# Altium footprint library 20-Switches.PcbLib: 110 footprints (part 7 of 7)
Each footprint in its own frame and in the unit in brackets; x right, y up, seen from the top. Pads: shape width x height; smd on the part's side, far side on the other; paste and mask are expansions set on the pad; w line width, h text height; cw(c..) or ccw(c..) is an arc to the next point about the centre after c.
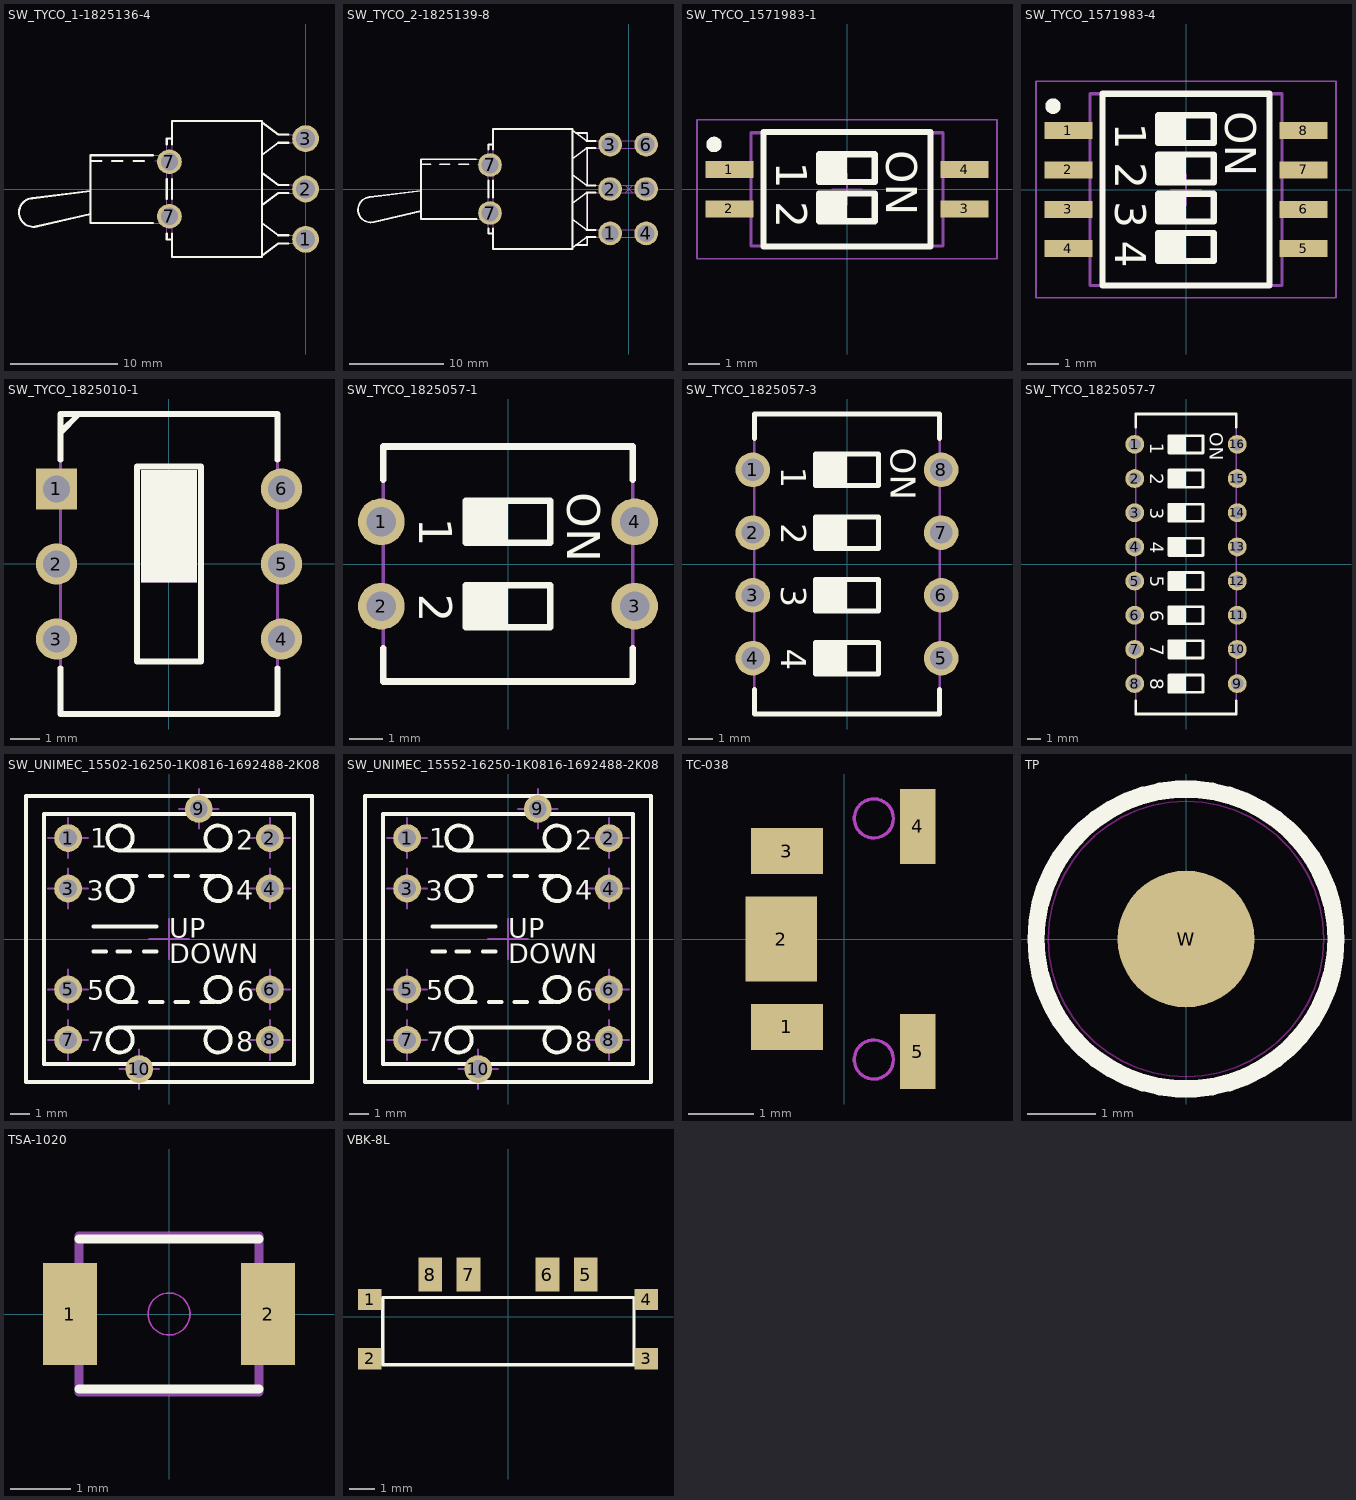
[diagram p6: the footprints below, top view; thin cyan lines are the x and y axes]

## SW_TYCO_1-1825136-4 [mm] "Right Angled SPDT Toggle Switch (ON,NONE,ON Function), .270\" Actuator, Unthreaded Bushing, A Series"
height 6.85
pads (5):
  round 2.5 hole 1.8: 1(0,-4.7) 2(0,0) 3(0,4.7)
  round 2.3 hole 1.6: 7(-12.7,-2.54) 7(-12.7,2.54)
Top Overlay:
  lines w0.2: -20.066,-2.343 -25.037,-3.479 cw(c-25.399,-2.194) -25.498,-0.863 -20.066,-0.184 ; -20.066,2.615 -19.066,2.615 ; -18.066,2.615 -17.066,2.615 ; -16.066,2.615 -15.066,2.615 ; -14.234,3.148 -20.066,3.148 -20.066,-3.175 -14.223,-3.175 ; -12.954,-4.17 -12.954,-4.7 -12.446,-4.7 ; -12.954,-0.91 -12.954,0.91 ; -12.954,4.17 -12.954,4.7 -12.446,4.7 ; -12.446,-4.17 -12.446,-6.35 -4.064,-6.35 ; -12.446,-0.91 -12.446,0.91 ; -12.446,4.17 -12.446,6.35 -4.064,6.35 ; -4.064,-6.2 -2.572,-5.081 -1.605,-5.081 ; -4.064,-3.2 -2.572,-4.319 -1.605,-4.319 ; -4.064,-1.5 -2.572,-0.381 -1.605,-0.381 ; -4.064,1.5 -2.572,0.381 -1.605,0.381 ; -4.064,3.2 -2.572,4.319 -1.605,4.319 ; -4.064,6.2 -2.572,5.081 -1.605,5.081 ; -4.064,-6.35 -4.064,6.35 ; -4.064,-6.35 -4.064,6.35 ; -4.064,-6.35 -4.064,6.35 ; -4.064,-5.081 -4.064,-4.319 -4.064,-5.081 ; -4.064,-0.381 -4.064,0.381 -4.064,-0.381 ; -4.064,4.319 -4.064,5.081 -4.064,4.319
Mechanical 8:
  lines w0.1: -13.2,-2.54 -12.7,-2.54 ; -13.2,2.54 -12.7,2.54 ; -12.7,-3.04 -12.7,-2.54 ; -12.7,-2.04 -12.7,-2.54 ; -12.7,2.04 -12.7,2.54 ; -12.7,3.04 -12.7,2.54 ; -12.2,-2.54 -12.7,-2.54 ; -12.2,2.54 -12.7,2.54 ; -0.5,-4.7 0,-4.7 ; -0.5,0 0,0 ; -0.5,4.7 0,4.7 ; 0,-5.2 0,-4.7 ; 0,-4.2 0,-4.7 ; 0,-0.5 0,0 ; 0,0.5 0,0 ; 0,4.2 0,4.7 ; 0,5.2 0,4.7 ; 0.5,-4.7 0,-4.7 ; 0.5,0 0,0 ; 0.5,4.7 0,4.7
Mechanical 14:
  lines w0.1: -20.066,-2.343 -25.037,-3.479 cw(c-25.399,-2.194) -25.498,-0.863 -20.066,-0.184 ; -20.066,2.615 -19.066,2.615 ; -18.066,2.615 -17.066,2.615 ; -16.066,2.615 -15.066,2.615 ; -14.066,2.615 -13.066,2.615 ; -12.954,-3.175 -20.066,-3.175 -20.066,3.148 -12.954,3.148 ; -12.446,-4.7 -12.954,-4.7 -12.954,4.7 -12.446,4.7 ; -4.064,-6.2 -2.572,-5.081 0.635,-5.081 0.635,-4.319 -2.572,-4.319 -4.064,-3.2 ; -4.064,-1.5 -2.572,-0.381 0.635,-0.381 0.635,0.381 -2.572,0.381 -4.064,1.5 ; -4.064,3.2 -2.572,4.319 0.635,4.319 0.635,5.081 -2.572,5.081 -4.064,6.2 ; -4.064,-6.35 -4.064,6.35 ; -4.064,-6.35 -4.064,6.35 ; -4.064,-6.35 -4.064,6.35 ; -4.064,-6.35 -12.446,-6.35 -12.446,6.35 -4.064,6.35 ; -4.064,-5.081 -4.064,-4.319 -4.064,-5.081 ; -4.064,-0.381 -4.064,0.381 -4.064,-0.381 ; -4.064,4.319 -4.064,5.081 -4.064,4.319
3D body "SW_TYCO_1-1825136-4.stp": height 6.86, standoff -3.17, extent -26.714,-6.35 0.635,6.35

## SW_TYCO_2-1825139-8 [mm] "Right Angled DPDT Toggle Switch (ON,ON,ON Function), .270\" Actuator, Unthreaded Bushing, A Series"
height 11.43
pads (8):
  round 2.5 hole 1.8: 1(-1.982,-4.7) 2(-1.982,0) 3(-1.982,4.7) 4(1.828,-4.7) 5(1.828,0) 6(1.828,4.7) 7(-14.682,-2.54) 7(-14.682,2.54)
Top Overlay:
  lines w0.2: -27.403,-0.863 ccw(c-27.304,-2.194) -26.942,-3.479 ; -27.403,-0.863 ccw(c-27.304,-2.194) -26.942,-3.479 ; -27.403,-0.863 -21.971,-0.184 -27.403,-0.863 ; -26.942,-3.479 -21.971,-2.343 -26.942,-3.479 ; -21.971,-3.175 -21.971,3.148 ; -21.971,-3.175 -16.128,-3.175 -21.971,-3.175 ; -21.971,-3.175 -21.971,3.148 ; -21.971,3.148 -16.139,3.148 -21.971,3.148 ; -14.859,-4.7 -14.859,-4.17 -14.859,-4.7 ; -14.859,-4.7 -14.351,-4.7 -14.859,-4.7 ; -14.859,4.7 -14.859,4.17 -14.859,4.7 ; -14.859,4.7 -14.351,4.7 -14.859,4.7 ; -14.351,-6.35 -14.351,-4.17 -14.351,-6.35 ; -14.351,-6.35 -5.969,-6.35 ; -14.351,-6.35 -5.969,-6.35 ; -14.351,6.35 -14.351,4.17 -14.351,6.35 ; -14.351,6.35 -5.969,6.35 ; -14.351,6.35 -5.969,6.35 ; -5.969,-6.35 -5.969,6.35 ; -5.969,-6.35 -5.969,6.35 ; -5.969,-6.35 -5.969,6.35 ; -5.969,-6.35 -5.969,6.35 ; -5.969,-6.35 -5.969,6.35 ; -5.969,-6.35 -5.969,6.35 ; -5.969,-5.081 -5.969,-4.319 ; -5.969,-5.081 -5.969,-4.319 ; -5.969,-5.081 -5.969,-4.319 ; -5.969,-5.081 -5.969,-4.319 ; -5.969,-0.381 -5.969,0.381 ; -5.969,-0.381 -5.969,0.381 ; -5.969,-0.381 -5.969,0.381 ; -5.969,-0.381 -5.969,0.381 ; -5.969,4.319 -5.969,5.081 ; -5.969,4.319 -5.969,5.081 ; -5.969,4.319 -5.969,5.081 ; -5.969,4.319 -5.969,5.081 ; -4.477,-5.081 -3.51,-5.081 -4.477,-5.081 ; -4.477,-5.081 -5.969,-6.2 -4.477,-5.081 ; -4.477,-4.319 -3.51,-4.319 -4.477,-4.319 ; -4.477,-4.319 -5.969,-3.2 -4.477,-4.319 ; -4.477,-0.381 -3.51,-0.381 -4.477,-0.381 ; -4.477,-0.381 -5.969,-1.5 -4.477,-0.381 ; -4.477,0.381 -3.51,0.381 -4.477,0.381 ; -4.477,0.381 -5.969,1.5 -4.477,0.381 ; -4.477,4.319 -3.51,4.319 -4.477,4.319 ; -4.477,4.319 -5.969,3.2 -4.477,4.319 ; -4.477,5.081 -3.51,5.081 -4.477,5.081 ; -4.477,5.081 -5.969,6.2 -4.477,5.081 ; -4.4,-5.94 -5.622,-5.94 -4.4,-5.94 ; -4.4,-5.94 -4.4,-5.081 -4.4,-5.94 ; -4.4,5.94 -4.4,5.081 -4.4,5.94 ; -4.4,5.94 -5.622,5.94 -4.4,5.94 ; -21.971,2.615 -20.971,2.615 -21.971,2.615 ; -19.971,2.615 -18.971,2.615 -19.971,2.615 ; -17.971,2.615 -16.971,2.615 -17.971,2.615 ; -14.859,-0.91 -14.859,0.91 -14.859,-0.91 ; -14.351,-0.91 -14.351,0.91 -14.351,-0.91 ; -4.4,-4.319 -4.4,-0.381 -4.4,-4.319 ; -4.4,0.381 -4.4,4.319 -4.4,0.381
Mechanical 8:
  lines w0.1: -15.105,-2.54 -14.605,-2.54 ; -15.105,2.54 -14.605,2.54 ; -14.605,-3.04 -14.605,-2.54 ; -14.605,-2.04 -14.605,-2.54 ; -14.605,2.04 -14.605,2.54 ; -14.605,3.04 -14.605,2.54 ; -14.105,-2.54 -14.605,-2.54 ; -14.105,2.54 -14.605,2.54 ; -2.405,-4.7 -1.905,-4.7 ; -2.405,0 -1.905,0 ; -2.405,4.7 -1.905,4.7 ; -1.905,-5.2 -1.905,-4.7 ; -1.905,-4.2 -1.905,-4.7 ; -1.905,-0.5 -1.905,0 ; -1.905,0.5 -1.905,0 ; -1.905,4.2 -1.905,4.7 ; -1.905,5.2 -1.905,4.7 ; -1.405,-4.7 -1.905,-4.7 ; -1.405,0 -1.905,0 ; -1.405,4.7 -1.905,4.7 ; -0.354,-0.354 0,0 ; -0.354,0.354 0,0 ; 0.354,-0.354 0,0 ; 0.354,0.354 0,0 ; 1.405,-4.7 1.905,-4.7 ; 1.405,0 1.905,0 ; 1.405,4.7 1.905,4.7 ; 1.905,-5.2 1.905,-4.7 ; 1.905,-4.2 1.905,-4.7 ; 1.905,-0.5 1.905,0 ; 1.905,0.5 1.905,0 ; 1.905,4.2 1.905,4.7 ; 1.905,5.2 1.905,4.7 ; 2.405,-4.7 1.905,-4.7 ; 2.405,0 1.905,0 ; 2.405,4.7 1.905,4.7
Mechanical 14:
  lines w0.1: -27.403,-0.863 ccw(c-27.304,-2.194) -26.942,-3.479 ; -27.403,-0.863 ccw(c-27.304,-2.194) -26.942,-3.479 ; -27.403,-0.863 -21.971,-0.184 -27.403,-0.863 ; -26.942,-3.479 -21.971,-2.343 -26.942,-3.479 ; -21.971,-3.175 -21.971,3.148 ; -21.971,-3.175 -14.859,-3.175 -21.971,-3.175 ; -21.971,-3.175 -21.971,3.148 ; -21.971,3.148 -14.859,3.148 -21.971,3.148 ; -14.859,-4.7 -14.351,-4.7 -14.859,-4.7 ; -14.859,-4.7 -14.859,4.7 ; -14.859,-4.7 -14.859,4.7 ; -14.859,4.7 -14.351,4.7 -14.859,4.7 ; -14.351,-6.35 -14.351,6.35 ; -14.351,-6.35 -5.969,-6.35 ; -14.351,-6.35 -14.351,6.35 ; -14.351,-6.35 -5.969,-6.35 ; -14.351,6.35 -5.969,6.35 ; -14.351,6.35 -5.969,6.35 ; -5.969,-6.35 -5.969,6.35 ; -5.969,-6.35 -5.969,6.35 ; -5.969,-6.35 -5.969,6.35 ; -5.969,-6.35 -5.969,6.35 ; -5.969,-6.35 -5.969,6.35 ; -5.969,-6.35 -5.969,6.35 ; -5.969,-5.081 -5.969,-4.319 ; -5.969,-5.081 -5.969,-4.319 ; -5.969,-5.081 -5.969,-4.319 ; -5.969,-5.081 -5.969,-4.319 ; -5.969,-0.381 -5.969,0.381 ; -5.969,-0.381 -5.969,0.381 ; -5.969,-0.381 -5.969,0.381 ; -5.969,-0.381 -5.969,0.381 ; -5.969,4.319 -5.969,5.081 ; -5.969,4.319 -5.969,5.081 ; -5.969,4.319 -5.969,5.081 ; -5.969,4.319 -5.969,5.081 ; -4.477,-5.081 2.54,-5.081 ; -4.477,-5.081 -5.969,-6.2 -4.477,-5.081 ; -4.477,-5.081 2.54,-5.081 ; -4.477,-4.319 2.54,-4.319 ; -4.477,-4.319 -5.969,-3.2 -4.477,-4.319 ; -4.477,-4.319 2.54,-4.319 ; -4.477,-0.381 2.54,-0.381 ; -4.477,-0.381 -5.969,-1.5 -4.477,-0.381 ; -4.477,-0.381 2.54,-0.381 ; -4.477,0.381 2.54,0.381 ; -4.477,0.381 -5.969,1.5 -4.477,0.381 ; -4.477,0.381 2.54,0.381 ; -4.477,4.319 2.54,4.319 ; -4.477,4.319 -5.969,3.2 -4.477,4.319 ; -4.477,4.319 2.54,4.319 ; -4.477,5.081 2.54,5.081 ; -4.477,5.081 -5.969,6.2 -4.477,5.081 ; -4.477,5.081 2.54,5.081 ; -4.4,-5.94 -4.4,-5.081 -4.4,-5.94 ; -4.4,-5.94 -5.622,-5.94 -4.4,-5.94 ; -4.4,5.94 -4.4,5.081 -4.4,5.94 ; -4.4,5.94 -5.622,5.94 -4.4,5.94 ; 2.54,-5.081 2.54,-4.319 ; 2.54,-5.081 2.54,-4.319 ; 2.54,-0.381 2.54,0.381 ; 2.54,-0.381 2.54,0.381 ; 2.54,4.319 2.54,5.081 ; 2.54,4.319 2.54,5.081 ; -21.971,2.615 -20.971,2.615 -21.971,2.615 ; -19.971,2.615 -18.971,2.615 -19.971,2.615 ; -17.971,2.615 -16.971,2.615 -17.971,2.615 ; -15.971,2.615 -14.971,2.615 -15.971,2.615 ; -4.4,-4.319 -4.4,-0.381 -4.4,-4.319 ; -4.4,0.381 -4.4,4.319 -4.4,0.381
3D body "SW_TYCO_2-1825139-8.stp": height 11.43, standoff -3.81, extent -28.619,-6.35 2.54,6.35

## SW_TYCO_1571983-1 [mm] "Pitch 1.27mm,  Body 3.66x6.2mm, 2 Ways SPST Surface-Mount DIP Switch, TYCO GDH Serie"
height 2.31
pads (4):
  rect 1.55x0.55 smd: 1(-3.8,0.635) 2(-3.8,-0.635) 3(3.8,-0.635) 4(3.8,0.635)
Top Overlay:
  circle w0.25: c-4.3,1.45 r0.125
  region: -0.9,1.135 -0.9,0.235 0,0.235 0,1.135
  region: -0.9,-0.135 -0.9,-1.035 0,-1.035 0,-0.135
  lines w0.2: -2.7,-1.85 2.7,-1.85 2.7,1.85 -2.7,1.85 -2.7,-1.85 ; -0.9,-1.035 -0.9,-0.135 0.9,-0.135 0.9,-1.035 -0.9,-1.035 ; -0.9,0.235 -0.9,1.135 0.9,1.135 0.9,0.235 -0.9,0.235
  text "1" at -2.286,0.889 h1
  text "2" at -2.286,-0.381 h1
  text "ON" at 1.27,1.27 h1
Mechanical 14:
  region: -0.9,1.135 -0.9,0.235 0,0.235 0,1.135
  region: -0.9,-0.135 -0.9,-1.035 0,-1.035 0,-0.135
  lines w0.1: -3.1,-1.83 -3.1,1.83 3.1,1.83 3.1,-1.83 -3.1,-1.83 ; -0.9,-1.035 -0.9,-0.135 0.9,-0.135 0.9,-1.035 -0.9,-1.035 ; -0.9,0.235 -0.9,1.135 0.9,1.135 0.9,0.235 -0.9,0.235
  text "1" at -2.276,0.889 h1
  text "2" at -2.276,-0.381 h1
  text "ON" at 1.28,1.27 h1
Mechanical 15:
  lines w0.05: -0.5,0 0.5,0 ; 0,-0.5 0,0.5 ; -4.85,-2.25 -4.85,2.25 4.85,2.25 4.85,-2.25 -4.85,-2.25
3D body "SW_TYCO_1571983-1.stp": height 2.36, standoff 0, extent -4.06,-1.831 4.06,1.829

## SW_TYCO_1571983-4 [mm] "Pitch 1.27mm,  Body 6.2x6.2mm, 4 Ways SPST Surface-Mount DIP Switch, TYCO GDH Serie"
height 2.31
pads (8):
  rect 1.55x0.55 smd: 1(-3.8,1.905) 2(-3.8,0.635) 3(-3.8,-0.635) 4(-3.8,-1.905) 5(3.8,-1.905) 6(3.8,-0.635) 7(3.8,0.635) 8(3.8,1.905)
Top Overlay:
  circle w0.25: c-4.3,2.7 r0.125
  region: -0.9,2.405 -0.9,1.505 0,1.505 0,2.405
  region: -0.9,1.135 -0.9,0.235 0,0.235 0,1.135
  region: -0.9,-0.135 -0.9,-1.035 0,-1.035 0,-0.135
  region: -0.9,-1.405 -0.9,-2.305 0,-2.305 0,-1.405
  lines w0.2: -2.7,-3.1 2.7,-3.1 2.7,3.1 -2.7,3.1 -2.7,-3.1 ; -0.9,-2.305 0.9,-2.305 0.9,-1.405 -0.9,-1.405 -0.9,-2.305 ; -0.9,-1.035 -0.9,-0.135 0.9,-0.135 0.9,-1.035 -0.9,-1.035 ; -0.9,0.235 -0.9,1.135 0.9,1.135 0.9,0.235 -0.9,0.235 ; -0.9,1.505 -0.9,2.405 0.9,2.405 0.9,1.505 -0.9,1.505
  text "1" at -2.286,2.159 h1
  text "2" at -2.286,0.889 h1
  text "ON" at 1.27,2.54 h1
  text "3" at -2.286,-0.381 h1
  text "4" at -2.286,-1.651 h1
Mechanical 14:
  region: -0.9,2.405 -0.9,1.505 0,1.505 0,2.405
  region: -0.9,1.135 -0.9,0.235 0,0.235 0,1.135
  region: -0.9,-0.135 -0.9,-1.035 0,-1.035 0,-0.135
  region: -0.9,-1.405 -0.9,-2.305 0,-2.305 0,-1.405
  lines w0.1: -3.1,-3.1 3.1,-3.1 3.1,3.1 -3.1,3.1 -3.1,-3.1 ; -0.9,-2.305 0.9,-2.305 0.9,-1.405 -0.9,-1.405 -0.9,-2.305 ; -0.9,-1.035 -0.9,-0.135 0.9,-0.135 0.9,-1.035 -0.9,-1.035 ; -0.9,0.235 -0.9,1.135 0.9,1.135 0.9,0.235 -0.9,0.235 ; -0.9,1.505 -0.9,2.405 0.9,2.405 0.9,1.505 -0.9,1.505
  text "1" at -2.276,2.159 h1
  text "2" at -2.276,0.889 h1
  text "ON" at 1.28,2.54 h1
  text "3" at -2.276,-0.381 h1
  text "4" at -2.276,-1.651 h1
Mechanical 15:
  lines w0.05: -0.5,0 0.5,0 ; 0,-0.5 0,0.5 ; -4.85,-3.5 4.85,-3.5 4.85,3.5 -4.85,3.5 -4.85,-3.5
3D body "SW_TYCO_1571983-4.stp": height 2.36, standoff 0, extent -4.06,-3.101 4.061,3.099

## SW_TYCO_1825010-1 [mm] "Pitch 2.54mm,  Body 10.16x7.36mm, DPDT Slide DIP Switch, Extented Top Actuator, TYCO ASE/F Series"
height 8.31
pads (6):
  rect 1.4x1.4 hole 0.9: 1(-3.81,2.54)
  round 1.4 hole 0.9: 2(-3.81,0) 3(-3.81,-2.54) 4(3.81,-2.54) 5(3.81,0) 6(3.81,2.54)
Top Overlay:
  rectangle: -0.955,-0.635 0.955,3.175
  lines w0.2: -3.68,-3.532 -3.68,-5.08 3.68,-5.08 3.68,-3.532 ; -3.68,3.532 -3.68,5.08 3.68,5.08 3.68,3.532 ; -3.68,4.445 -3.045,5.08 ; -1.08,-3.3 -1.08,3.3 1.08,3.3 1.08,-3.3 -1.08,-3.3
Mechanical 14:
  rectangle: -0.955,-0.635 0.955,3.175
  lines w0.1: -3.68,4.445 -3.045,5.08 ; -3.68,-5.08 -3.68,5.08 3.68,5.08 3.68,-5.08 -3.68,-5.08 ; -1.08,-3.3 -1.08,3.3 1.08,3.3 1.08,-3.3 -1.08,-3.3
3D body "SW_TYCO_1825010-1.stp": height 8.31, standoff -3, extent -3.93,-5.08 3.93,5.08

## SW_TYCO_1825057-1 [mm] "Body 7.1x7.5mm, 2 Ways SPST DIP Switch, Thru Hole, TYCO AD Series"
height 5.5
pads (4):
  round 1.4 hole 0.9: 1(-3.81,1.27) 2(-3.81,-1.27) 3(3.81,-1.27) 4(3.81,1.27)
Top Overlay:
  region: -1.27,-0.635 -1.27,-1.905 0,-1.905 0,-0.635
  region: -1.27,1.905 -1.27,0.635 0,0.635 0,1.905
  lines w0.2: -3.746,-2.54 -3.746,-3.531 3.746,-3.531 3.746,-2.54 ; -3.746,2.54 -3.746,3.531 3.746,3.531 3.746,2.54 ; -1.27,-1.905 1.27,-1.905 1.27,-0.635 -1.27,-0.635 -1.27,-1.905 ; -1.27,0.635 -1.27,1.905 1.27,1.905 1.27,0.635 -1.27,0.635
  text "1" at -2.667,1.397 h1
  text "2" at -2.667,-0.889 h1
  text "ON" at 1.778,2.159 h1
Mechanical 14:
  region: -1.27,1.905 -1.27,0.635 0,0.635 0,1.905
  region: -1.27,-0.635 -1.27,-1.905 0,-1.905 0,-0.635
  lines w0.1: -3.746,-3.531 -3.746,3.531 3.746,3.531 3.746,-3.531 -3.746,-3.531 ; -1.27,-1.905 1.27,-1.905 1.27,-0.635 -1.27,-0.635 -1.27,-1.905 ; -1.27,0.635 -1.27,1.905 1.27,1.905 1.27,0.635 -1.27,0.635
  text "1" at -2.667,1.397 h1
  text "2" at -2.667,-0.889 h1
  text "ON" at 1.778,2.159 h1
3D body "SW_TYCO_1825057-1.stp": height 5.5, standoff -3.88, extent -3.935,-3.532 3.935,3.53

## SW_TYCO_1825057-3 [mm] "Body 12.1x7.5mm, 4 Ways SPST DIP Switch, Thru Hole, TYCO AD Series"
height 5.5
pads (8):
  round 1.4 hole 0.9: 1(-3.81,3.81) 2(-3.81,1.27) 3(-3.81,-1.27) 4(-3.81,-3.81) 5(3.81,-3.81) 6(3.81,-1.27) 7(3.81,1.27) 8(3.81,3.81)
Top Overlay:
  region: -1.27,-0.635 -1.27,-1.905 0,-1.905 0,-0.635
  region: -1.27,-3.175 -1.27,-4.445 0,-4.445 0,-3.175
  region: -1.27,1.905 -1.27,0.635 0,0.635 0,1.905
  region: -1.27,4.445 -1.27,3.175 0,3.175 0,4.445
  lines w0.2: -3.746,-5.08 -3.746,-6.071 3.746,-6.071 3.746,-5.08 ; -3.746,5.08 -3.746,6.071 3.746,6.071 3.746,5.08 ; -1.27,-4.445 1.27,-4.445 1.27,-3.175 -1.27,-3.175 -1.27,-4.445 ; -1.27,-1.905 1.27,-1.905 1.27,-0.635 -1.27,-0.635 -1.27,-1.905 ; -1.27,0.635 1.27,0.635 1.27,1.905 -1.27,1.905 -1.27,0.635 ; -1.27,3.175 -1.27,4.445 1.27,4.445 1.27,3.175 -1.27,3.175
  text "1" at -2.667,3.937 h1
  text "3" at -2.667,-0.889 h1
  text "2" at -2.667,1.651 h1
  text "4" at -2.667,-3.429 h1
  text "ON" at 1.778,4.699 h1
Mechanical 14:
  region: -1.27,4.445 -1.27,3.175 0,3.175 0,4.445
  region: -1.27,-0.635 -1.27,-1.905 0,-1.905 0,-0.635
  region: -1.27,1.905 -1.27,0.635 0,0.635 0,1.905
  region: -1.27,-3.175 -1.27,-4.445 0,-4.445 0,-3.175
  lines w0.1: -3.746,-6.071 -3.746,6.071 3.746,6.071 3.746,-6.071 -3.746,-6.071 ; -1.27,-4.445 1.27,-4.445 1.27,-3.175 -1.27,-3.175 -1.27,-4.445 ; -1.27,-1.905 1.27,-1.905 1.27,-0.635 -1.27,-0.635 -1.27,-1.905 ; -1.27,0.635 1.27,0.635 1.27,1.905 -1.27,1.905 -1.27,0.635 ; -1.27,3.175 -1.27,4.445 1.27,4.445 1.27,3.175 -1.27,3.175
  text "1" at -2.667,3.937 h1
  text "3" at -2.667,-0.889 h1
  text "2" at -2.667,1.651 h1
  text "4" at -2.667,-3.429 h1
  text "ON" at 1.778,4.699 h1
3D body "SW_TYCO_1825057-3.stp": height 5.5, standoff -3.88, extent -3.935,-6.03 3.935,6.07

## SW_TYCO_1825057-7 [mm] "Body 22.3x7.5mm, 8 Ways SPST DIP Switch, Thru Hole, TYCO AD Series"
height 5.5
pads (16):
  round 1.4 hole 0.9: 1(-3.81,8.89) 2(-3.81,6.35) 3(-3.81,3.81) 4(-3.81,1.27) 5(-3.81,-1.27) 6(-3.81,-3.81) 7(-3.81,-6.35) 8(-3.81,-8.89) 9(3.81,-8.89) 10(3.81,-6.35) 11(3.81,-3.81) 12(3.81,-1.27) 13(3.81,1.27) 14(3.81,3.81) 15(3.81,6.35) 16(3.81,8.89)
Top Overlay:
  region: -1.27,4.445 -1.27,3.175 0,3.175 0,4.445
  region: -1.27,-8.255 -1.27,-9.525 0,-9.525 0,-8.255
  region: -1.27,-5.715 -1.27,-6.985 0,-6.985 0,-5.715
  region: -1.27,-3.175 -1.27,-4.445 0,-4.445 0,-3.175
  region: -1.27,-0.635 -1.27,-1.905 0,-1.905 0,-0.635
  region: -1.27,1.905 -1.27,0.635 0,0.635 0,1.905
  region: -1.27,6.985 -1.27,5.715 0,5.715 0,6.985
  region: -1.27,9.525 -1.27,8.255 0,8.255 0,9.525
  lines w0.2: -3.746,-10.16 -3.746,-11.151 3.746,-11.151 3.746,-10.16 ; -3.746,10.16 -3.746,11.151 3.746,11.151 3.746,10.16 ; -1.27,-9.525 1.27,-9.525 1.27,-8.255 -1.27,-8.255 -1.27,-9.525 ; -1.27,-6.985 1.27,-6.985 1.27,-5.715 -1.27,-5.715 -1.27,-6.985 ; -1.27,-4.445 1.27,-4.445 1.27,-3.175 -1.27,-3.175 -1.27,-4.445 ; -1.27,-1.905 1.27,-1.905 1.27,-0.635 -1.27,-0.635 -1.27,-1.905 ; -1.27,0.635 1.27,0.635 1.27,1.905 -1.27,1.905 -1.27,0.635 ; -1.27,3.175 1.27,3.175 1.27,4.445 -1.27,4.445 -1.27,3.175 ; -1.27,5.715 1.27,5.715 1.27,6.985 -1.27,6.985 -1.27,5.715 ; -1.27,8.255 -1.27,9.525 1.27,9.525 1.27,8.255 -1.27,8.255
  text "1" at -2.667,9.017 h1
  text "3" at -2.667,4.191 h1
  text "2" at -2.667,6.731 h1
  text "5" at -2.667,-0.889 h1
  text "4" at -2.667,1.651 h1
  text "6" at -2.667,-3.429 h1
  text "7" at -2.667,-5.969 h1
  text "8" at -2.667,-8.509 h1
  text "ON" at 1.778,9.779 h1
Mechanical 14:
  region: -1.27,9.525 -1.27,8.255 0,8.255 0,9.525
  region: -1.27,-8.255 -1.27,-9.525 0,-9.525 0,-8.255
  region: -1.27,-5.715 -1.27,-6.985 0,-6.985 0,-5.715
  region: -1.27,-3.175 -1.27,-4.445 0,-4.445 0,-3.175
  region: -1.27,-0.635 -1.27,-1.905 0,-1.905 0,-0.635
  region: -1.27,4.445 -1.27,3.175 0,3.175 0,4.445
  region: -1.27,6.985 -1.27,5.715 0,5.715 0,6.985
  region: -1.27,1.905 -1.27,0.635 0,0.635 0,1.905
  lines w0.1: -3.746,-11.151 -3.746,11.151 3.746,11.151 3.746,-11.151 -3.746,-11.151 ; -1.27,-9.525 1.27,-9.525 1.27,-8.255 -1.27,-8.255 -1.27,-9.525 ; -1.27,-6.985 1.27,-6.985 1.27,-5.715 -1.27,-5.715 -1.27,-6.985 ; -1.27,-4.445 1.27,-4.445 1.27,-3.175 -1.27,-3.175 -1.27,-4.445 ; -1.27,-1.905 1.27,-1.905 1.27,-0.635 -1.27,-0.635 -1.27,-1.905 ; -1.27,0.635 1.27,0.635 1.27,1.905 -1.27,1.905 -1.27,0.635 ; -1.27,3.175 1.27,3.175 1.27,4.445 -1.27,4.445 -1.27,3.175 ; -1.27,5.715 1.27,5.715 1.27,6.985 -1.27,6.985 -1.27,5.715 ; -1.27,8.255 -1.27,9.525 1.27,9.525 1.27,8.255 -1.27,8.255
  text "1" at -2.667,9.017 h1
  text "3" at -2.667,4.191 h1
  text "2" at -2.667,6.731 h1
  text "5" at -2.667,-0.889 h1
  text "4" at -2.667,1.651 h1
  text "6" at -2.667,-3.429 h1
  text "7" at -2.667,-5.969 h1
  text "8" at -2.667,-8.509 h1
  text "ON" at 1.778,9.779 h1
3D body "SW_TYCO_1825057-7.stp": height 5.5, standoff -3.88, extent -3.935,-11.15 3.935,11.15

## SW_UNIMEC_15502-16250-1K0816-1692488-2K08 [mm] "Body 12.5x12.5mm, Momentary Gold 2 Poles Switch With Extender + Red Cap + Red LED + Red Bezel"
height 31
pads (10):
  round 1.4 hole 0.9: 1(-5.08,5.08) 2(5.08,5.08) 3(-5.08,2.54) 4(5.08,2.54) 5(-5.08,-2.54) 6(5.08,-2.54) 7(-5.08,-5.08) 8(5.08,-5.08) 9(1.5,6.55) 10(-1.5,-6.55)
Top Overlay:
  circle w0.2: c2.465,2.54 r0.635
  circle w0.2: c2.465,-5.08 r0.635
  circle w0.2: c-2.465,2.54 r0.635
  circle w0.2: c-2.465,-5.08 r0.635
  circle w0.2: c2.465,5.08 r0.635
  circle w0.2: c2.465,-2.54 r0.635
  circle w0.2: c-2.465,5.08 r0.635
  circle w0.2: c-2.465,-2.54 r0.635
  lines w0.2: -3.81,-0.635 -3.175,-0.635 ; -3.81,0.635 -0.635,0.635 ; -2.59,-0.635 -1.955,-0.635 ; -2.54,-4.445 2.54,-4.445 ; -2.54,4.445 2.54,4.445 ; -2.272,-3.175 -1.637,-3.175 ; -2.272,3.175 -1.637,3.175 ; -1.27,-0.635 -0.635,-0.635 ; -0.953,-3.175 -0.318,-3.175 ; -0.953,3.175 -0.318,3.175 ; 0.318,-3.175 0.953,-3.175 ; 0.318,3.175 0.953,3.175 ; 1.637,-3.175 2.272,-3.175 ; 1.637,3.175 2.272,3.175 ; -7.2,-7.2 -7.2,7.2 7.2,7.2 7.2,-7.2 -7.2,-7.2 ; -6.3,-6.3 6.3,-6.3 6.3,6.3 -6.3,6.3 -6.3,-6.3
  text "5" at -4.126,-3.054 h1
  text "1" at -3.976,4.596 h1
  text "6" at 3.439,-3.119 h1
  text "2" at 3.389,4.501 h1
  text "7" at -4.101,-5.654 h1
  text "3" at -4.131,1.961 h1
  text "8" at 3.389,-5.659 h1
  text "4" at 3.389,1.986 h1
  text "UP" at 0,0.056 h1
  text "DOWN" at 0,-1.214 h1
Mechanical 8:
  lines w0.1: -6.08,-5.08 -5.08,-5.08 ; -6.08,-2.54 -5.08,-2.54 ; -6.08,2.54 -5.08,2.54 ; -6.08,5.08 -5.08,5.08 ; -5.08,-6.08 -5.08,-5.08 ; -5.08,-4.08 -5.08,-5.08 ; -5.08,-3.54 -5.08,-2.54 ; -5.08,-1.54 -5.08,-2.54 ; -5.08,1.54 -5.08,2.54 ; -5.08,3.54 -5.08,2.54 ; -5.08,4.08 -5.08,5.08 ; -5.08,6.08 -5.08,5.08 ; -4.08,-5.08 -5.08,-5.08 ; -4.08,-2.54 -5.08,-2.54 ; -4.08,2.54 -5.08,2.54 ; -4.08,5.08 -5.08,5.08 ; -2.5,-6.55 -1.5,-6.55 ; -1.5,-7.55 -1.5,-6.55 ; -1.5,-5.55 -1.5,-6.55 ; -1,0 0,0 ; -0.5,-6.55 -1.5,-6.55 ; 0,-1 0,0 ; 0,1 0,0 ; 0.5,6.55 1.5,6.55 ; 1,0 0,0 ; 1.5,5.55 1.5,6.55 ; 1.5,7.55 1.5,6.55 ; 2.5,6.55 1.5,6.55 ; 4.08,-5.08 5.08,-5.08 ; 4.08,-2.54 5.08,-2.54 ; 4.08,2.54 5.08,2.54 ; 4.08,5.08 5.08,5.08 ; 5.08,-6.08 5.08,-5.08 ; 5.08,-4.08 5.08,-5.08 ; 5.08,-3.54 5.08,-2.54 ; 5.08,-1.54 5.08,-2.54 ; 5.08,1.54 5.08,2.54 ; 5.08,3.54 5.08,2.54 ; 5.08,4.08 5.08,5.08 ; 5.08,6.08 5.08,5.08 ; 6.08,-5.08 5.08,-5.08 ; 6.08,-2.54 5.08,-2.54 ; 6.08,2.54 5.08,2.54 ; 6.08,5.08 5.08,5.08
Mechanical 14:
  circle w0.1: c2.465,2.54 r0.635
  circle w0.1: c2.465,-5.08 r0.635
  circle w0.1: c-2.465,2.54 r0.635
  circle w0.1: c-2.465,-5.08 r0.635
  circle w0.1: c2.465,5.08 r0.635
  circle w0.1: c2.465,-2.54 r0.635
  circle w0.1: c-2.465,5.08 r0.635
  circle w0.1: c-2.465,-2.54 r0.635
  lines w0.1: -3.81,-0.635 -3.175,-0.635 ; -3.81,0.635 -0.635,0.635 ; -2.59,-0.635 -1.955,-0.635 ; -2.54,-4.445 2.54,-4.445 ; -2.54,4.445 2.54,4.445 ; -2.272,-3.175 -1.637,-3.175 ; -2.272,3.175 -1.637,3.175 ; -1.27,-0.635 -0.635,-0.635 ; -0.953,-3.175 -0.318,-3.175 ; -0.953,3.175 -0.318,3.175 ; 0.318,-3.175 0.953,-3.175 ; 0.318,3.175 0.953,3.175 ; 1.637,-3.175 2.272,-3.175 ; 1.637,3.175 2.272,3.175 ; -7.2,-7.2 -7.2,7.2 7.2,7.2 7.2,-7.2 -7.2,-7.2 ; -6.3,-6.3 6.3,-6.3 6.3,6.3 -6.3,6.3 -6.3,-6.3
  text "5" at -4.126,-3.054 h1
  text "1" at -3.976,4.596 h1
  text "6" at 3.439,-3.119 h1
  text "2" at 3.389,4.501 h1
  text "7" at -4.101,-5.654 h1
  text "3" at -4.131,1.961 h1
  text "8" at 3.389,-5.659 h1
  text "4" at 3.389,1.986 h1
  text "UP" at 0,0.056 h1
  text "DOWN" at 0,-1.214 h1
3D body "SW_UNIMEC_15552-16250-1K0816-1692488-2K08.stp": height 31, standoff -3.6, extent -7.2,-7.2 7.2,7.2

## SW_UNIMEC_15552-16250-1K0816-1692488-2K08 [mm] "Body 12.5x12.5mm, Alternate Gold 2 Poles Switch With Extender + Red Cap + Red LED + Red Bezel"
height 31
pads (10):
  round 1.4 hole 0.9: 1(-5.08,5.08) 2(5.08,5.08) 3(-5.08,2.54) 4(5.08,2.54) 5(-5.08,-2.54) 6(5.08,-2.54) 7(-5.08,-5.08) 8(5.08,-5.08) 9(1.5,6.55) 10(-1.5,-6.55)
Top Overlay:
  circle w0.2: c-2.465,-2.54 r0.635
  circle w0.2: c-2.465,5.08 r0.635
  circle w0.2: c2.465,-2.54 r0.635
  circle w0.2: c2.465,5.08 r0.635
  circle w0.2: c-2.465,-5.08 r0.635
  circle w0.2: c-2.465,2.54 r0.635
  circle w0.2: c2.465,-5.08 r0.635
  circle w0.2: c2.465,2.54 r0.635
  lines w0.2: -3.81,-0.635 -3.175,-0.635 ; -3.81,0.635 -0.635,0.635 ; -2.59,-0.635 -1.955,-0.635 ; -2.54,-4.445 2.54,-4.445 ; -2.54,4.445 2.54,4.445 ; -2.272,-3.175 -1.637,-3.175 ; -2.272,3.175 -1.637,3.175 ; -1.27,-0.635 -0.635,-0.635 ; -0.953,-3.175 -0.318,-3.175 ; -0.953,3.175 -0.318,3.175 ; 0.318,-3.175 0.953,-3.175 ; 0.318,3.175 0.953,3.175 ; 1.637,-3.175 2.272,-3.175 ; 1.637,3.175 2.272,3.175 ; -7.2,-7.2 7.2,-7.2 7.2,7.2 -7.2,7.2 -7.2,-7.2 ; -6.3,-6.3 -6.3,6.3 6.3,6.3 6.3,-6.3 -6.3,-6.3
  text "DOWN" at 0,-1.214 h1
  text "UP" at 0,0.056 h1
  text "4" at 3.389,1.986 h1
  text "8" at 3.389,-5.659 h1
  text "3" at -4.131,1.961 h1
  text "7" at -4.101,-5.654 h1
  text "2" at 3.389,4.501 h1
  text "6" at 3.439,-3.119 h1
  text "1" at -3.976,4.596 h1
  text "5" at -4.126,-3.054 h1
Mechanical 8:
  lines w0.1: -6.08,-5.08 -5.08,-5.08 ; -6.08,-2.54 -5.08,-2.54 ; -6.08,2.54 -5.08,2.54 ; -6.08,5.08 -5.08,5.08 ; -5.08,-6.08 -5.08,-5.08 ; -5.08,-4.08 -5.08,-5.08 ; -5.08,-3.54 -5.08,-2.54 ; -5.08,-1.54 -5.08,-2.54 ; -5.08,1.54 -5.08,2.54 ; -5.08,3.54 -5.08,2.54 ; -5.08,4.08 -5.08,5.08 ; -5.08,6.08 -5.08,5.08 ; -4.08,-5.08 -5.08,-5.08 ; -4.08,-2.54 -5.08,-2.54 ; -4.08,2.54 -5.08,2.54 ; -4.08,5.08 -5.08,5.08 ; -2.5,-6.55 -1.5,-6.55 ; -1.5,-7.55 -1.5,-6.55 ; -1.5,-5.55 -1.5,-6.55 ; -1,0 0,0 ; -0.5,-6.55 -1.5,-6.55 ; 0,-1 0,0 ; 0,1 0,0 ; 0.5,6.55 1.5,6.55 ; 1,0 0,0 ; 1.5,5.55 1.5,6.55 ; 1.5,7.55 1.5,6.55 ; 2.5,6.55 1.5,6.55 ; 4.08,-5.08 5.08,-5.08 ; 4.08,-2.54 5.08,-2.54 ; 4.08,2.54 5.08,2.54 ; 4.08,5.08 5.08,5.08 ; 5.08,-6.08 5.08,-5.08 ; 5.08,-4.08 5.08,-5.08 ; 5.08,-3.54 5.08,-2.54 ; 5.08,-1.54 5.08,-2.54 ; 5.08,1.54 5.08,2.54 ; 5.08,3.54 5.08,2.54 ; 5.08,4.08 5.08,5.08 ; 5.08,6.08 5.08,5.08 ; 6.08,-5.08 5.08,-5.08 ; 6.08,-2.54 5.08,-2.54 ; 6.08,2.54 5.08,2.54 ; 6.08,5.08 5.08,5.08
Mechanical 14:
  circle w0.1: c-2.465,-2.54 r0.635
  circle w0.1: c-2.465,5.08 r0.635
  circle w0.1: c2.465,-2.54 r0.635
  circle w0.1: c2.465,5.08 r0.635
  circle w0.1: c-2.465,-5.08 r0.635
  circle w0.1: c-2.465,2.54 r0.635
  circle w0.1: c2.465,-5.08 r0.635
  circle w0.1: c2.465,2.54 r0.635
  lines w0.1: -3.81,-0.635 -3.175,-0.635 ; -3.81,0.635 -0.635,0.635 ; -2.59,-0.635 -1.955,-0.635 ; -2.54,-4.445 2.54,-4.445 ; -2.54,4.445 2.54,4.445 ; -2.272,-3.175 -1.637,-3.175 ; -2.272,3.175 -1.637,3.175 ; -1.27,-0.635 -0.635,-0.635 ; -0.953,-3.175 -0.318,-3.175 ; -0.953,3.175 -0.318,3.175 ; 0.318,-3.175 0.953,-3.175 ; 0.318,3.175 0.953,3.175 ; 1.637,-3.175 2.272,-3.175 ; 1.637,3.175 2.272,3.175 ; -7.2,-7.2 7.2,-7.2 7.2,7.2 -7.2,7.2 -7.2,-7.2 ; -6.3,-6.3 -6.3,6.3 6.3,6.3 6.3,-6.3 -6.3,-6.3
  text "DOWN" at 0,-1.214 h1
  text "UP" at 0,0.056 h1
  text "4" at 3.389,1.986 h1
  text "8" at 3.389,-5.659 h1
  text "3" at -4.131,1.961 h1
  text "7" at -4.101,-5.654 h1
  text "2" at 3.389,4.501 h1
  text "6" at 3.439,-3.119 h1
  text "1" at -3.976,4.596 h1
  text "5" at -4.126,-3.054 h1
3D body "SW_UNIMEC_15552-16250-1K0816-1692488-2K08.stp": height 31, standoff -3.6, extent -7.2,-7.2 7.2,7.2

## TC-038 [mm]
height 31
pads (5):
  rect 1.1x0.7 smd mask+0.07: 1(-0.876,-1.35) 3(-0.876,1.35)
  rect 1.1x1.3 smd mask+0.07: 2(-0.965,0)
  rect 0.55x1.15 smd mask+0.07: 4(1.13,1.727) 5(1.13,-1.727)
Keep-Out Layer:
  circle w0.05: c0.457,1.85 r0.3
  circle w0.05: c0.457,-1.85 r0.3
Mechanical 1:
  circle w0.05: c0.457,1.85 r0.3
  circle w0.05: c0.457,-1.85 r0.3
3D body "0_55-1_15.stp": height 0.01, standoff 0, extent 0.855,1.152 1.405,2.302
3D body "0_55-1_15.stp": height 0.01, standoff 0, extent 0.855,-2.302 1.405,-1.152
3D body "tc-038.stp": height 1.61, standoff -0.5, extent -1.187,-1.95 1.898,1.95
3D body "0_7-1_1.stp": height 0.01, standoff 0, extent -1.427,1 -0.326,1.7
3D body "0_7-1_1.stp": height 0.01, standoff 0, extent -1.427,-1.7 -0.326,-1
3D body "1_3-1-1.stp": height 0.01, standoff 0, extent -1.524,-0.65 -0.424,0.65

## TP [mm]
height 11.7
pads (1):
  round 2 smd mask+1: W(0,0)
Top Overlay:
  circle w0.254: c0,0 r2.195
Keep-Out Layer:
  circle w0.025: c0,0 r2.017
3D body "1_016-1_016-3_tp.stp": height 0.02, standoff 0, extent -1.5,-1.5 1.5,1.5

## TSA-1020 [mm] "3X4X2"
height 31
pads (2):
  rect 0.9x1.7 smd: 1(-1.65,0) 2(1.65,0)
Top Overlay:
  lines w0.152: -1.5,-1.25 1.5,-1.25 ; -1.5,1.25 1.5,1.25
Keep-Out Layer:
  circle w0.025: c0,0 r0.35
Mechanical 1:
  circle w0.025: c0,0 r0.35
Mechanical 14:
  lines w0.152: -1.5,-1.3 -1.5,1.3 1.5,1.3 1.5,-1.3 -1.5,-1.3
Mechanical 15:
  lines w0.152: -1.5,-1.3 -1.5,1.3 1.5,1.3 1.5,-1.3 -1.5,-1.3
3D body "tsa-1020.stp": height 1.6, standoff -0.5, extent -2,-1.25 2,1.25

## VBK-8L [mil]
height 1220.47
pads (8):
  rect 36x32 smd mask+0: 1(-210,26) 2(-210,-64) 3(210,-64) 4(210,26)
  rect 36x52 smd mask+2: 5(118,64) 6(60,64) 7(-60,64) 8(-118,64)
Top Overlay:
  lines w5: -190.5,-73 191.5,-73 191.5,29 -190.5,29 -190.5,-42 -190.5,-73
3D body "vbk-8l.stp": height 112.2, standoff -48.82, extent -212.6,-105.71 212.6,75